# Altium footprint library alex_footprint.PcbLib: 262 footprints (part 11 of 17)
Each footprint in its own frame and in the unit in brackets; x right, y up, seen from the top. Pads: shape width x height; smd on the part's side, far side on the other; paste and mask are expansions set on the pad; w line width, h text height; cw(c..) or ccw(c..) is an arc to the next point about the centre after c.
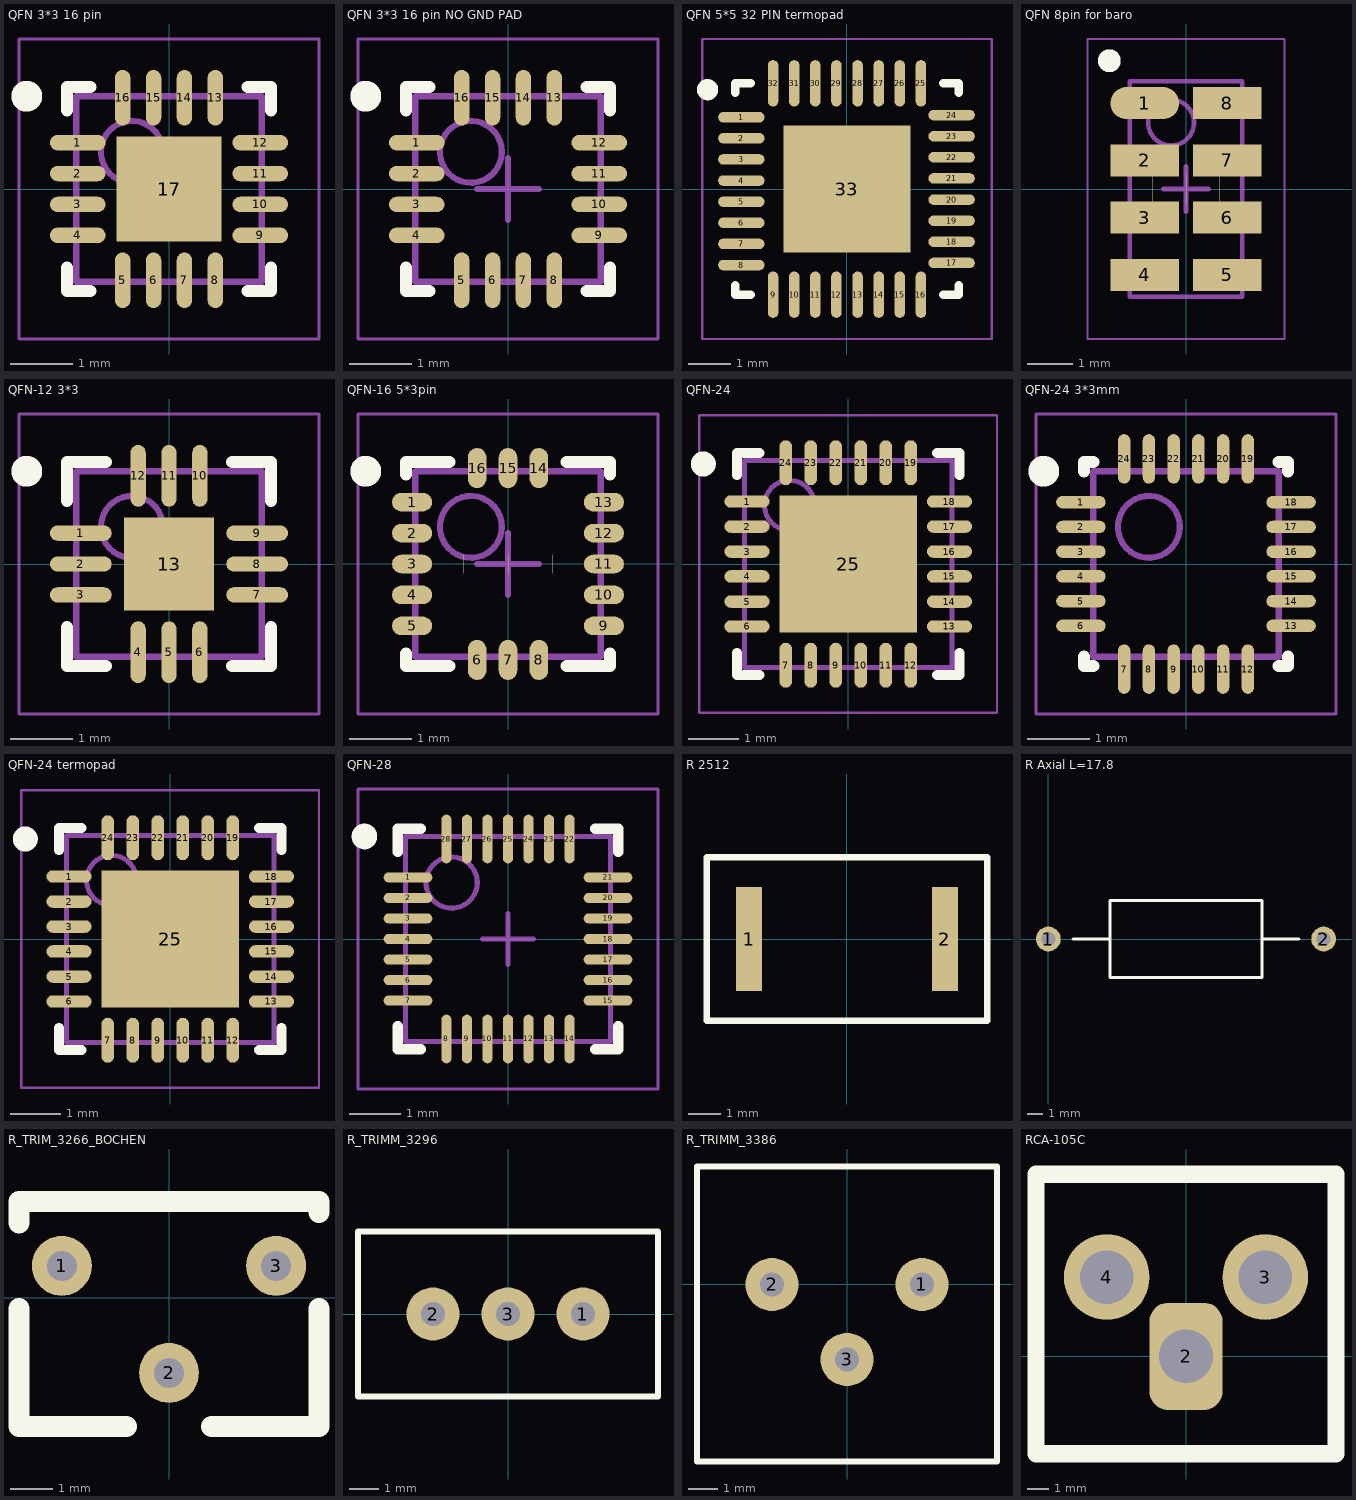
[diagram p10: the footprints below, top view; thin cyan lines are the x and y axes]

## QFN 3*3 16 pin [mm] "QFN, 16-Leads, Body 3,00x3,00mm, Pitch 0,50mm, Thermal Pad 1,70x1,70mm, IPC Low Density"
height 0.8
pads (17):
  oval 0.9x0.25 smd: 1(-1.475,0.75) 2(-1.475,0.25) 3(-1.475,-0.25) 4(-1.475,-0.75) 9(1.475,-0.75) 10(1.475,-0.25) 11(1.475,0.25) 12(1.475,0.75)
  oval 0.25x0.9 smd: 5(-0.75,-1.475) 6(-0.25,-1.475) 7(0.25,-1.475) 8(0.75,-1.475) 13(0.75,1.475) 14(0.25,1.475) 15(-0.25,1.475) 16(-0.75,1.475)
  rect 1.7x1.7 smd: 17(0,0)
Top Overlay:
  circle w0.25: c-2.3,1.5 r0.125
  lines w0.2: -1.65,-1.275 -1.65,-1.65 -1.275,-1.65 ; -1.65,1.275 -1.65,1.65 -1.275,1.65 ; 1.275,-1.65 1.65,-1.65 1.65,-1.275 ; 1.275,1.65 1.65,1.65 1.65,1.275
Mechanical 13:
  circle w0.1: c-0.6,0.6 r0.5
  lines w0.1: -1.5,-1.5 1.5,-1.5 1.5,1.5 -1.5,1.5 -1.5,-1.5
Mechanical 15:
  lines w0.05: -2.425,-2.425 2.425,-2.425 2.425,2.425 -2.425,2.425 -2.425,-2.425
  lines w0.1: -0.5,0 0.5,0 ; 0,-0.5 0,0.5
3D body: height 0.8, standoff 0.05, extent -1.5,-1.5 1.5,1.5

## QFN 3*3 16 pin NO GND PAD [mm] "QFN, 16-Leads, Body 3,00x3,00mm, Pitch 0,50mm, Thermal Pad 1,70x1,70mm, IPC Low Density"
height 0.8
pads (16):
  oval 0.9x0.25 smd: 1(-1.475,0.75) 2(-1.475,0.25) 3(-1.475,-0.25) 4(-1.475,-0.75) 9(1.475,-0.75) 10(1.475,-0.25) 11(1.475,0.25) 12(1.475,0.75)
  oval 0.25x0.9 smd: 5(-0.75,-1.475) 6(-0.25,-1.475) 7(0.25,-1.475) 8(0.75,-1.475) 13(0.75,1.475) 14(0.25,1.475) 15(-0.25,1.475) 16(-0.75,1.475)
Top Overlay:
  circle w0.25: c-2.3,1.5 r0.125
  lines w0.2: -1.65,-1.275 -1.65,-1.65 -1.275,-1.65 ; -1.65,1.275 -1.65,1.65 -1.275,1.65 ; 1.275,-1.65 1.65,-1.65 1.65,-1.275 ; 1.275,1.65 1.65,1.65 1.65,1.275
Mechanical 13:
  circle w0.1: c-0.6,0.6 r0.5
  lines w0.1: -1.5,-1.5 -1.5,1.5 1.5,1.5 1.5,-1.5 -1.5,-1.5
Mechanical 15:
  lines w0.05: -2.425,-2.425 -2.425,2.425 2.425,2.425 2.425,-2.425 -2.425,-2.425
  lines w0.1: -0.5,0 0.5,0 ; 0,-0.5 0,0.5
3D body: height 0.8, standoff 0.05, extent -1.5,-1.5 1.5,1.5

## QFN 5*5 32 PIN termopad [mm]
height 0.8
pads (41):
  oval 1.1x0.25 smd: 1(-2.5,1.7) 2(-2.5,1.2) 3(-2.5,0.7) 4(-2.5,0.2) 5(-2.5,-0.3) 6(-2.5,-0.8) 7(-2.5,-1.3) 8(-2.5,-1.8) 17(2.475,-1.75) 18(2.475,-1.25) 19(2.475,-0.75) 20(2.475,-0.25) 21(2.475,0.25) 22(2.475,0.75) 23(2.475,1.25) 24(2.475,1.75)
  oval 0.25x1.1 smd: 9(-1.75,-2.5) 10(-1.25,-2.5) 11(-0.75,-2.5) 12(-0.25,-2.5) 13(0.25,-2.5) 14(0.75,-2.5) 15(1.25,-2.5) 16(1.75,-2.5) 25(1.75,2.5) 26(1.25,2.5) 27(0.75,2.5) 28(0.25,2.5) 29(-0.25,2.5) 30(-0.75,2.5) 31(-1.25,2.5) 32(-1.75,2.5)
  rect 0x0 smd: 33(-0.725,0) 34(0,0) 35(0,0.725) 36(0,0) 37(0.725,0) 38(0,0) 39(0,-0.725) 40(0,0)
  rect 3x3 smd: 33(0,0)
Top Overlay:
  circle w0.25: c-3.3,2.35 r0.125
  lines w0.2: -2.65,-2.275 -2.65,-2.5 -2.275,-2.5 ; -2.65,2.275 -2.65,2.5 -2.275,2.5 ; 2.275,-2.5 2.65,-2.5 2.65,-2.275 ; 2.275,2.5 2.65,2.5 2.65,2.275
Mechanical 15:
  lines w0.05: -3.425,-3.55 3.425,-3.55 3.425,3.55 -3.425,3.55 -3.425,-3.55
3D body: height 0.8, standoff 0.05, extent -2.5,-2.35 2.5,2.35

## QFN 8pin for baro [mm]
height 1
pads (16):
  oval 1.5x0.7 smd: 1(-0.9,1.875)
  rect 1.5x0.7 smd: 2(-0.9,0.625) 3(-0.9,-0.625) 4(-0.9,-1.875) 5(0.9,-1.875) 6(0.9,-0.625) 7(0.9,0.625) 8(0.9,1.875)
  oval 0x0.7 smd: 9(-0.725,0) 10(0,0) 13(0.725,0) 14(0,0)
  oval 0.7x0 smd: 11(0,0.725) 12(0,0) 15(0,-0.725) 16(0,0)
Top Overlay:
  circle w0.25: c-1.675,2.8 r0.125
Mechanical 13:
  circle w0.1: c-0.325,1.45 r0.5
  lines w0.1: -1.225,-2.35 -1.225,2.35 1.225,2.35 1.225,-2.35 -1.225,-2.35
Mechanical 15:
  lines w0.05: -2.15,-3.275 -2.15,3.275 2.15,3.275 2.15,-3.275 -2.15,-3.275
  lines w0.1: -0.5,0 0.5,0 ; 0,-0.5 0,0.5
3D body: height 1, standoff 0.1, extent -1.225,-2.35 1.225,2.35

## QFN-12 3*3 [mm]
height 0.8
pads (21):
  oval 1x0.25 smd: 1(-1.425,0.5) 2(-1.425,0) 3(-1.425,-0.5) 7(1.425,-0.5) 8(1.425,0) 9(1.425,0.5)
  oval 0.25x1 smd: 4(-0.5,-1.425) 5(0,-1.425) 6(0.5,-1.425) 10(0.5,1.425) 11(0,1.425) 12(-0.5,1.425)
  rect 0x0 smd: 13(-0.725,0) 14(0,0) 15(0,0.725) 16(0,0) 17(0.725,0) 18(0,0) 19(0,-0.725) 20(0,0)
  rect 1.45x1.5 smd: 13(0,0)
Top Overlay:
  circle w0.25: c-2.3,1.5 r0.125
  lines w0.2: -1.65,-1.025 -1.65,-1.65 -1.025,-1.65 ; -1.65,1.025 -1.65,1.65 -1.025,1.65 ; 1.025,-1.65 1.65,-1.65 1.65,-1.025 ; 1.025,1.65 1.65,1.65 1.65,1.025
Mechanical 13:
  circle w0.1: c-0.6,0.6 r0.5
  lines w0.1: -1.5,-1.5 -1.5,1.5 1.5,1.5 1.5,-1.5 -1.5,-1.5
Mechanical 15:
  lines w0.05: -2.425,-2.425 -2.425,2.425 2.425,2.425 2.425,-2.425 -2.425,-2.425
  lines w0.1: -0.5,0 0.5,0 ; 0,-0.5 0,0.5
3D body: height 0.8, standoff 0.05, extent -1.5,-1.5 1.5,1.5

## QFN-16 5*3pin [mm]
height 0.62
pads (24):
  oval 0.65x0.3 smd: 1(-1.55,1) 2(-1.55,0.5) 3(-1.55,0) 4(-1.55,-0.5) 5(-1.55,-1) 9(1.55,-1) 10(1.55,-0.5) 11(1.55,0) 12(1.55,0.5) 13(1.55,1)
  oval 0.3x0.65 smd: 6(-0.5,-1.55) 7(0,-1.55) 8(0.5,-1.55) 14(0.5,1.55) 15(0,1.55) 16(-0.5,1.55)
  rect 0x0.3 smd: 17(-0.725,0) 18(0,0) 21(0.725,0) 22(0,0)
  rect 0.3x0 smd: 19(0,0.725) 20(0,0) 23(0,-0.725) 24(0,0)
Top Overlay:
  circle w0.25: c-2.3,1.5 r0.125
  lines w0.2: -1.65,-1.45 -1.65,-1.65 -0.95,-1.65 ; -1.65,1.45 -1.65,1.65 -0.95,1.65 ; 0.95,-1.65 1.65,-1.65 1.65,-1.45 ; 0.95,1.65 1.65,1.65 1.65,1.45
Mechanical 13:
  circle w0.1: c-0.6,0.6 r0.5
  lines w0.1: -1.5,-1.5 -1.5,1.5 1.5,1.5 1.5,-1.5 -1.5,-1.5
Mechanical 15:
  lines w0.05: -2.425,-2.425 -2.425,2.425 2.425,2.425 2.425,-2.425 -2.425,-2.425
  lines w0.1: -0.5,0 0.5,0 ; 0,-0.5 0,0.5
3D body: height 0.62, standoff 0.11, extent -1.5,-1.5 1.5,1.5

## QFN-24 [mm] "QFN, 24-Leads, Body 4,00x4,00mm, Pitch 0,50mm, Thermal Pad 2,75x2,75mm, IPC Low Density"
height 0.85
pads (25):
  oval 0.9x0.25 smd: 1(-2.025,1.25) 2(-2.025,0.75) 3(-2.025,0.25) 4(-2.025,-0.25) 5(-2.025,-0.75) 6(-2.025,-1.25) 13(2.025,-1.25) 14(2.025,-0.75) 15(2.025,-0.25) 16(2.025,0.25) 17(2.025,0.75) 18(2.025,1.25)
  oval 0.25x0.9 smd: 7(-1.25,-2.025) 8(-0.75,-2.025) 9(-0.25,-2.025) 10(0.25,-2.025) 11(0.75,-2.025) 12(1.25,-2.025) 19(1.25,2.025) 20(0.75,2.025) 21(0.25,2.025) 22(-0.25,2.025) 23(-0.75,2.025) 24(-1.25,2.025)
  rect 2.75x2.75 smd: 25(0,0)
Top Overlay:
  circle w0.25: c-2.9,2 r0.125
  lines w0.2: -2.225,-1.775 -2.225,-2.225 -1.775,-2.225 ; -2.225,1.775 -2.225,2.225 -1.775,2.225 ; 1.775,-2.225 2.225,-2.225 2.225,-1.775 ; 1.775,2.225 2.225,2.225 2.225,1.775
Mechanical 13:
  circle w0.1: c-1.175,1.175 r0.5
  lines w0.1: -2.075,-2.075 -2.075,2.075 2.075,2.075 2.075,-2.075 -2.075,-2.075
Mechanical 15:
  lines w0.05: -2.975,-2.975 -2.975,2.975 2.975,2.975 2.975,-2.975 -2.975,-2.975
  lines w0.1: -0.5,0 0.5,0 ; 0,-0.5 0,0.5
3D body: height 0.85, standoff 0.02, extent -2.075,-2.075 2.075,2.075

## QFN-24 3*3mm [mm]
height 0.9
pads (32):
  oval 0.8x0.2 smd: 1(-1.7,1) 2(-1.7,0.6) 3(-1.7,0.2) 4(-1.7,-0.2) 5(-1.7,-0.6) 6(-1.7,-1) 13(1.7,-1) 14(1.7,-0.6) 15(1.7,-0.2) 16(1.7,0.2) 17(1.7,0.6) 18(1.7,1)
  oval 0.2x0.8 smd: 7(-1,-1.7) 8(-0.6,-1.7) 9(-0.2,-1.7) 10(0.2,-1.7) 11(0.6,-1.7) 12(1,-1.7) 19(1,1.7) 20(0.6,1.7) 21(0.2,1.7) 22(-0.2,1.7) 23(-0.6,1.7) 24(-1,1.7)
  rect 0x0 smd: 25(-0.725,0) 26(0,0) 27(0,0.725) 28(0,0) 29(0.725,0) 30(0,0) 31(0,-0.725) 32(0,0)
Top Overlay:
  circle w0.25: c-2.3,1.5 r0.125
  lines w0.2: -1.65,-1.5 -1.65,-1.65 -1.5,-1.65 ; -1.65,1.5 -1.65,1.65 -1.5,1.65 ; 1.5,-1.65 1.65,-1.65 1.65,-1.5 ; 1.5,1.65 1.65,1.65 1.65,1.5
Mechanical 13:
  circle w0.1: c-0.6,0.6 r0.5
  lines w0.1: -1.5,-1.5 1.5,-1.5 1.5,1.5 -1.5,1.5 -1.5,-1.5
Mechanical 15:
  lines w0.05: -2.425,-2.425 2.425,-2.425 2.425,2.425 -2.425,2.425 -2.425,-2.425
3D body: height 0.9, standoff 0.02, extent -1.5,-1.5 1.5,1.5

## QFN-24 termopad [mm] "QFN, 24-Leads, Body 4,00x4,00mm, Pitch 0,50mm, Thermal Pad 2,75x2,75mm, IPC Low Density"
height 0.85
pads (25):
  oval 0.9x0.25 smd: 1(-2.025,1.25) 2(-2.025,0.75) 3(-2.025,0.25) 4(-2.025,-0.25) 5(-2.025,-0.75) 6(-2.025,-1.25) 13(2.025,-1.25) 14(2.025,-0.75) 15(2.025,-0.25) 16(2.025,0.25) 17(2.025,0.75) 18(2.025,1.25)
  oval 0.25x0.9 smd: 7(-1.25,-2.025) 8(-0.75,-2.025) 9(-0.25,-2.025) 10(0.25,-2.025) 11(0.75,-2.025) 12(1.25,-2.025) 19(1.25,2.025) 20(0.75,2.025) 21(0.25,2.025) 22(-0.25,2.025) 23(-0.75,2.025) 24(-1.25,2.025)
  rect 2.75x2.75 smd: 25(0,0)
Top Overlay:
  circle w0.25: c-2.9,2 r0.125
  lines w0.2: -2.225,-1.775 -2.225,-2.225 -1.775,-2.225 ; -2.225,1.775 -2.225,2.225 -1.775,2.225 ; 1.775,-2.225 2.225,-2.225 2.225,-1.775 ; 1.775,2.225 2.225,2.225 2.225,1.775
Mechanical 13:
  circle w0.1: c-1.175,1.175 r0.5
  lines w0.1: -2.075,-2.075 -2.075,2.075 2.075,2.075 2.075,-2.075 -2.075,-2.075
Mechanical 15:
  lines w0.05: -2.975,-2.975 -2.975,2.975 2.975,2.975 2.975,-2.975 -2.975,-2.975
  lines w0.1: -0.5,0 0.5,0 ; 0,-0.5 0,0.5
3D body: height 0.85, standoff 0.02, extent -2.075,-2.075 2.075,2.075

## QFN-28 [mm]
height 0.8
pads (36):
  oval 0.95x0.2 smd: 1(-1.95,1.2) 2(-1.95,0.8) 3(-1.95,0.4) 4(-1.95,0) 5(-1.95,-0.4) 6(-1.95,-0.8) 7(-1.95,-1.2) 15(1.95,-1.2) 16(1.95,-0.8) 17(1.95,-0.4) 18(1.95,0) 19(1.95,0.4) 20(1.95,0.8) 21(1.95,1.2)
  oval 0.2x0.95 smd: 8(-1.2,-1.95) 9(-0.8,-1.95) 10(-0.4,-1.95) 11(0,-1.95) 12(0.4,-1.95) 13(0.8,-1.95) 14(1.2,-1.95) 22(1.2,1.95) 23(0.8,1.95) 24(0.4,1.95) 25(0,1.95) 26(-0.4,1.95) 27(-0.8,1.95) 28(-1.2,1.95)
  rect 0x0 smd: 29(-0.725,0) 30(0,0) 31(0,0.725) 32(0,0) 33(0.725,0) 34(0,0) 35(0,-0.725) 36(0,0)
Top Overlay:
  circle w0.25: c-2.8,2 r0.125
  lines w0.2: -2.15,-1.7 -2.15,-2.15 -1.7,-2.15 ; -2.15,1.7 -2.15,2.15 -1.7,2.15 ; 1.7,-2.15 2.15,-2.15 2.15,-1.7 ; 1.7,2.15 2.15,2.15 2.15,1.7
Mechanical 13:
  circle w0.1: c-1.1,1.1 r0.5
  lines w0.1: -2,-2 2,-2 2,2 -2,2 -2,-2
Mechanical 15:
  lines w0.05: -2.925,-2.925 2.925,-2.925 2.925,2.925 -2.925,2.925 -2.925,-2.925
  lines w0.1: -0.5,0 0.5,0 ; 0,-0.5 0,0.5
3D body: height 0.8, standoff 0.05, extent -2,-2 2,2

## R 2512 [mm]
pads (2):
  rect 0.8x3.2 smd: 1(-3,0) 2(3,0)
Top Overlay:
  lines w0.2: -4.3,-2.5 4.3,-2.5 4.3,2.5 -4.3,2.5 -4.3,0 -4.3,-2.5

## R Axial L=17.8 [mm]
pads (2):
  round 1.6 hole 0.9: 1(0,0) 2(17.8,0)
Top Overlay:
  lines w0.2: 1.6,0 3.975,0 ; 13.825,0 16.2,0 ; 3.975,0 3.975,-2.5 13.825,-2.5 13.825,2.5 3.975,2.5 3.975,0

## R_TRIM_3266_BOCHEN [mm]
pads (3):
  round 1.4 hole 0.7 unplated mask+0.25: 1(-2.5,0.75) 2(0,-1.75) 3(2.5,0.75)
Top Overlay:
  lines w0.5: -3.5,-0.25 -3.5,-3 -2.5,-3 -1,-3 ; -3.5,1.75 -3.5,2 -3.5,2.25 3.5,2.25 3.5,2 ; 1,-3 3.5,-3 3.5,-0.25

## R_TRIMM_3296 [mm]
pads (3):
  round 1.8 hole 0.8 unplated: 1(2.54,0) 2(-2.54,0) 3(0,0)
Top Overlay:
  lines w0.2: -5.08,-2.8 -5.08,2.8 5.08,2.8 5.08,-2.8 -5.08,-2.8

## R_TRIMM_3386 [mm]
pads (3):
  round 1.8 hole 0.8 unplated: 1(2.54,0) 2(-2.54,0) 3(0,-2.54)
Top Overlay:
  lines w0.2: -5.08,-6 5.08,-6 5.08,4 -5.08,4 -5.08,-6

## RCA-105C [mm]
pads (3):
  rrect50% 3.4x5 hole 2.5 unplated: 2(0,0)
  round 4 hole 2.5 unplated: 3(3.7,3.7) 4(-3.7,3.7)
Top Overlay:
  lines w0.8: 7,-4.546 -7,-4.546 -7,8.5 7,8.5 7,-4.5